# Altium footprint library 2.52-直插元件.PcbLib: 467 footprints (part 1 of 30)
Each footprint in its own frame and in the unit in brackets; x right, y up, seen from the top. Pads: shape width x height; smd on the part's side, far side on the other; paste and mask are expansions set on the pad; w line width, h text height; cw(c..) or ccw(c..) is an arc to the next point about the centre after c.
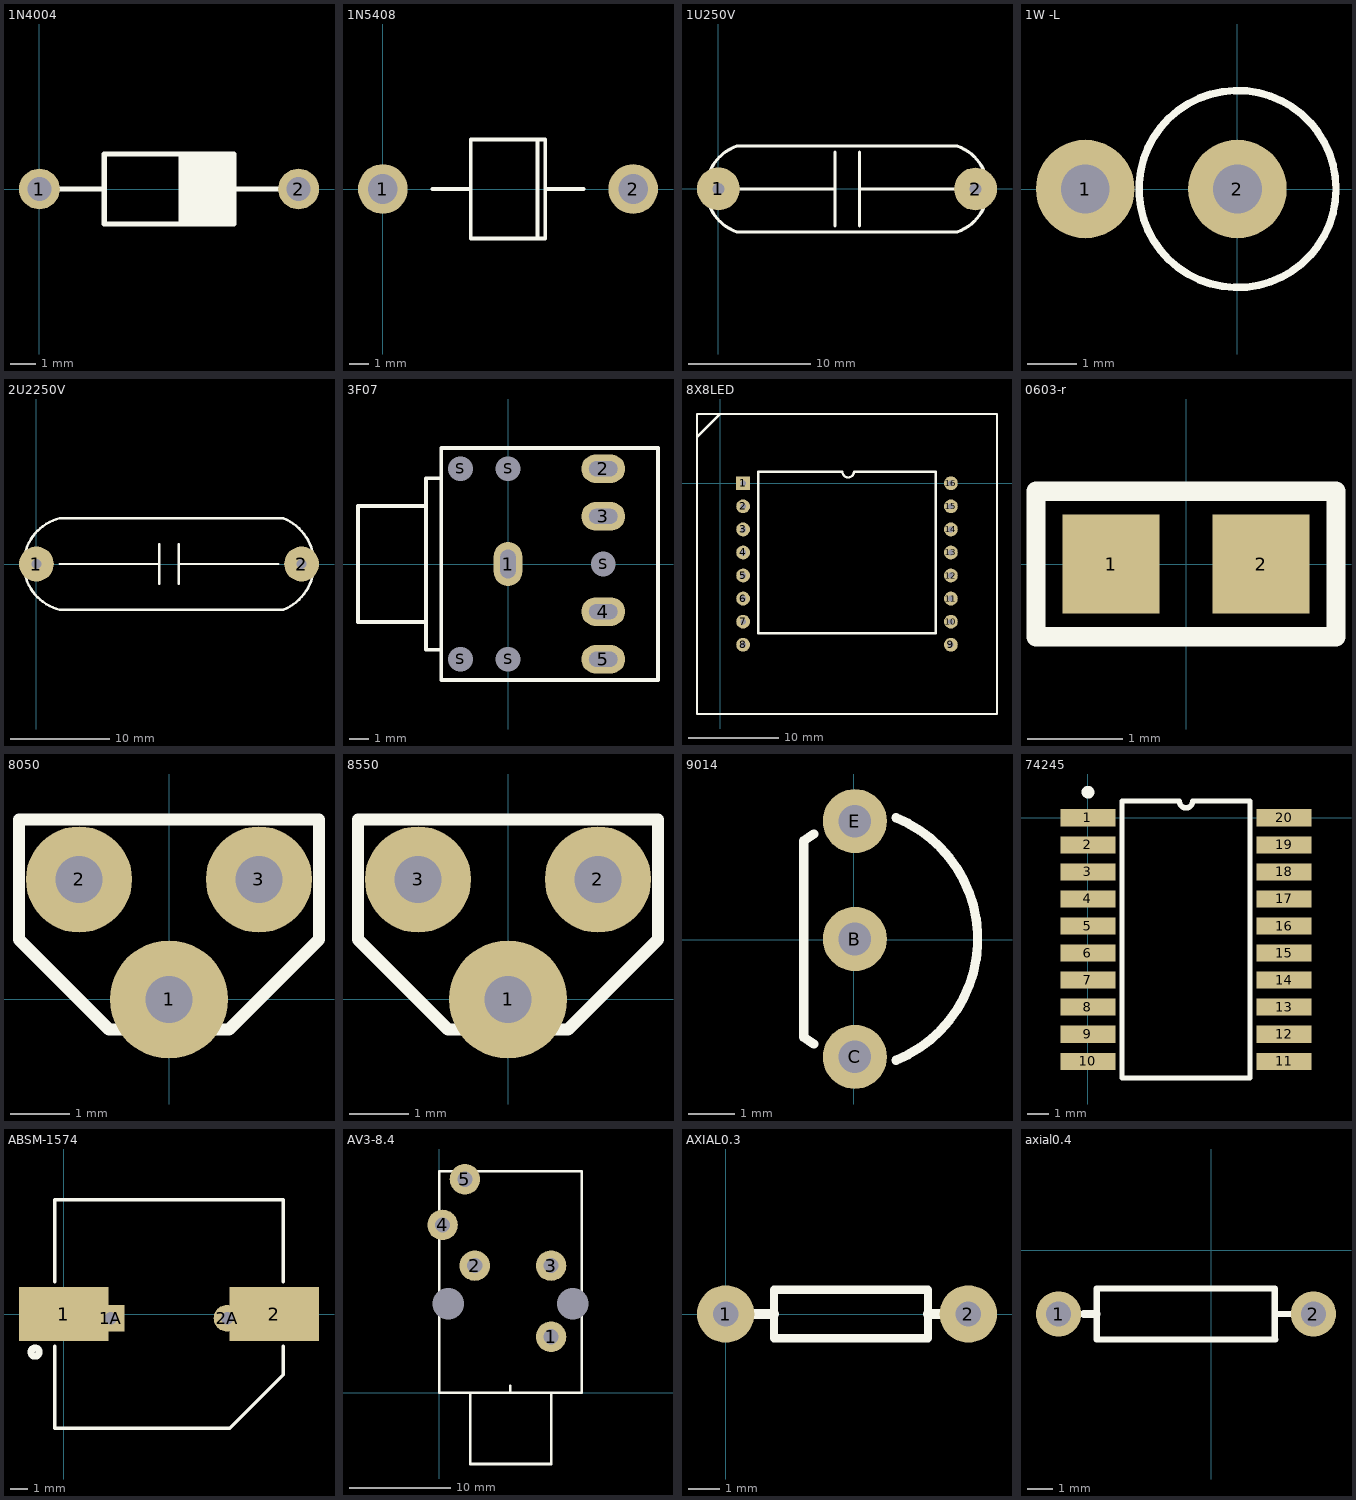
[diagram p0: the footprints below, top view; thin cyan lines are the x and y axes]

## 1N4004 [mil] "淘宝ID:黄晶宝石"
pads (2):
  round 62 hole 36: 1(0,0) 2(393.7,0)
Top Overlay:
  lines w5.91: 214.57,-53.15 214.57,53.15 ; 218.5,-53.15 218.5,53.15 ; 222.44,-53.15 222.44,53.15 ; 226.38,-53.15 226.38,53.15 ; 230.31,-53.15 230.31,53.15 ; 234.25,-53.15 234.25,53.15 ; 238.19,-53.15 238.19,53.15 ; 242.13,-53.15 242.13,53.15 ; 246.06,-53.15 246.06,53.15 ; 250,-53.15 250,53.15 ; 253.94,-53.15 253.94,53.15 ; 257.87,-53.15 257.87,53.15 ; 261.81,-53.15 261.81,53.15 ; 265.75,-53.15 265.75,53.15 ; 269.69,-53.15 269.69,53.15 ; 273.62,-53.15 273.62,53.15 ; 277.56,-53.15 277.56,53.15 ; 281.5,-53.15 281.5,53.15 ; 285.43,-53.15 285.43,53.15 ; 289.37,-53.15 289.37,53.15 ; 293.31,-53.15 293.31,53.15
  lines w7.87: 23.62,0 98.42,0 ; 295.28,0 370.08,0 ; 98.42,-53.15 98.42,53.15 295.28,53.15 295.28,-53.15 98.42,-53.15

## 1N5408 [mm] "淘宝ID:黄晶宝石"
pads (2):
  round 2.5 hole 1.5: 1(0,0) 2(12.6,0)
Top Overlay:
  lines w0.2: 2.5,0 4.425,0 ; 7.775,-2.5 7.775,2.5 ; 8.175,0 10.1,0 ; 4.425,0 4.425,2.5 8.175,2.5 8.175,-2.5 4.425,-2.5 4.425,0

## 1U250V [mm] "淘宝ID:黄晶宝石"
pads (2):
  round 3.5 hole 1: 1(0,0) 2(21.007,-0.01)
Top Overlay:
  lines w0.25: 0.007,-0.01 9.507,-0.01 ; 9.507,-3.01 9.507,2.99 ; 11.507,-3.01 11.507,2.99 ; 11.507,-0.01 21.007,-0.01 ; 1.507,-3.51 cw(c2.707,-0.01) 1.507,3.49 19.507,3.49 cw(c18.307,-0.01) 19.507,-3.51 1.507,-3.51

## 1W -L [mil] "封装库来自淘宝卖家 ID：黄晶宝石"
pads (2):
  round 79 hole 39: 1(-122.05,0) 2(0,0)
Top Overlay:
  circle w6: c0,0 r79
3D body "1W Carbon Film Resistor.STEP": height 572.61, standoff -75.5, extent -137.23,-83.35 83.23,82

## 2U2250V [mm]
pads (2):
  round 3.5 hole 1: 1(0,0) 2(26.67,0)
Top Overlay:
  lines w0.25: 2.335,0 12.335,0 ; 12.335,-2 12.335,2 ; 14.335,-2 14.335,2 ; 14.335,0 24.335,0 ; 2.335,-4.6 cw(c3.474,0) 2.335,4.6 24.835,4.6 cw(c22.974,0) 24.835,-4.6 2.335,-4.6

## 3F07 [mm] "立体声耳机插座"
pads (10):
  oval 1.5x2.3 hole 0.8 slot 1.5 at 90 deg: 1(0,0)
  oval 2.3x1.5 hole 0.8 slot 1.5 at 0 deg: 2(5,5) 3(5,2.5) 4(5,-2.5) 5(5,-5)
  round 1 hole 1.3: S(-2.5,-5) S(-2.5,5) S(0,-5) S(0,5) S(5,0)
Top Overlay:
  lines w0.2: -4.318,-3.048 -7.874,-3.048 -7.874,3.048 -4.318,3.048 ; -3.5,-4.5 -4.3,-4.5 -4.3,4.5 -3.5,4.5 ; -3.5,-6.096 7.874,-6.096 7.874,6.096 -3.5,6.096 -3.5,0 -3.5,-6.096
3D body: height 6, standoff 0, extent -7.874,-3.048 -4.318,3.048
3D body: height 6, standoff 0, extent -4.318,-4.445 -3.429,4.445
3D body: height 6, standoff 0, extent -3.429,-5.969 7.874,5.969

## 8X8LED [mil]
pads (16):
  rect 60x60 hole 25: 1(100,0)
  round 60 hole 25: 2(100,-100) 3(100,-200) 4(100,-300) 5(100,-400) 6(100,-500) 7(100,-600) 8(100,-700) 9(1000,-700) 10(1000,-600) 11(1000,-500) 12(1000,-400) 13(1000,-300) 14(1000,-200) 15(1000,-100) 16(1000,0)
Top Overlay:
  lines w10: -100,200 0,300 ; -100,-1000 1200,-1000 1200,300 -100,300 -100,-1000 ; 165,-650 935,-650 935,50 580,50 cw(c555,50) 530,50 165,50 165,-650

## 0603-r [mil]
pads (2):
  rect 40x41 smd: 1(-31,0) 2(31,0)
Top Overlay:
  lines w8: -62,-30 62,-30 62,30 -62,30 -62,-30

## 8050 [mm]
pads (3):
  round 2 hole 0.8: 1(0,0)
  round 1.8 hole 0.8: 2(-1.524,2.032) 3(1.524,2.032)
Top Overlay:
  lines w0.203: -2.54,1.016 -2.54,3.048 2.54,3.048 2.54,1.016 1.016,-0.508 -1.016,-0.508 -2.54,1.016

## 8550 [mm]
pads (3):
  round 2 hole 0.8: 1(0,0)
  round 1.8 hole 0.8: 2(1.524,2.032) 3(-1.524,2.032)
Top Overlay:
  lines w0.203: -2.54,1.016 -1.016,-0.508 1.016,-0.508 2.54,1.016 2.54,3.048 -2.54,3.048 -2.54,1.016

## 9014 [mm]
pads (3):
  round 1.38 hole 0.7: B(0.025,0.013) C(0.025,-2.527) E(0.025,2.553)
Top Overlay:
  lines w0.2: -0.856,-2.25 -1.075,-2.104 -1.075,2.129 -0.856,2.275 ; 0.911,-2.597 ccw(c-0.144,0.013) 0.911,2.623

## 74245 [mm]
pads (20):
  rect 2.6x0.8 smd: 1(0,0) 2(0,-1.27) 3(0,-2.54) 4(0,-3.81) 5(0,-5.08) 6(0,-6.35) 7(0,-7.62) 8(0,-8.89) 9(0,-10.16) 10(0,-11.43) 11(9.2,-11.43) 12(9.2,-10.16) 13(9.2,-8.89) 14(9.2,-7.62) 15(9.2,-6.35) 16(9.2,-5.08) 17(9.2,-3.81) 18(9.2,-2.54) 19(9.2,-1.27) 20(9.2,0)
Top Overlay:
  circle w0.3: c0,1.2 r0.15
  lines w0.25: 1.6,-12.215 7.6,-12.215 7.6,0.785 4.917,0.785 cw(c4.6,0.785) 4.282,0.785 1.6,0.785 1.6,-12.215

## ABSM-1574 [mm] "Magnetic Transducer Buzzer"
pads (4):
  rect 5x3 smd: 1(0,0) 2(11.8,0)
  rect 1.5x1.5 hole 0.7: 1A(2.65,-0.24)
  round 1.5 hole 0.7: 2A(9.15,-0.24)
Top Overlay:
  circle w0.4: c-1.6,-2.134 r0.227
  lines w0.2: -0.5,-1.8 -0.5,-6.4 9.3,-6.4 12.3,-3.4 12.3,-1.8 ; -0.5,1.8 -0.5,6.4 12.3,6.4 12.3,1.8

## AV3-8.4 [mm]
pads (7):
  round 3 hole 1.5: 1(11,5.5) 2(3.5,12.5) 3(11,12.5) 4(0.325,16.5) 5(2.525,21)
  round 3 hole 3.1 unplated: ""(0.9,8.75) ""(13.15,8.75)
Top Overlay:
  lines w0.254: 3.04,0 3.04,-7.02 11.02,-7.02 11.02,0 ; 7,0 7,0.66 ; 0,0 0,21.8 14,21.8 14,0 0,0
3D body "User Library-Mouser_161-4320.STEP": height 40.92, standoff -4.32, extent 0.3,-8.208 17.115,23.008

## AXIAL0.3 [mm]
pads (2):
  round 1.8 hole 0.8: 1(0,0) 2(7.62,0)
Top Overlay:
  lines w0.254: 1.524,-0.762 6.35,-0.762 6.35,0.762 1.524,0.762 1.524,-0.762
  lines w0.305: 0.762,0 1.524,0 ; 6.35,0 6.858,0

## axial0.4 [mm]
pads (2):
  round 1.8 hole 1: 1(-6.096,-2.54) 2(4.064,-2.54)
Top Overlay:
  lines w0.254: 2.516,-3.532 2.516,-1.524 -4.572,-1.524 -4.572,-3.556 2.54,-3.556 ; 2.516,-2.54 3.302,-2.54
  lines w0.305: -5.08,-2.54 -4.572,-2.54